# Altium integrated library LEMO Unipole And Multipole Type Connectors.IntLib: 1566 symbols (part 11 of 13)
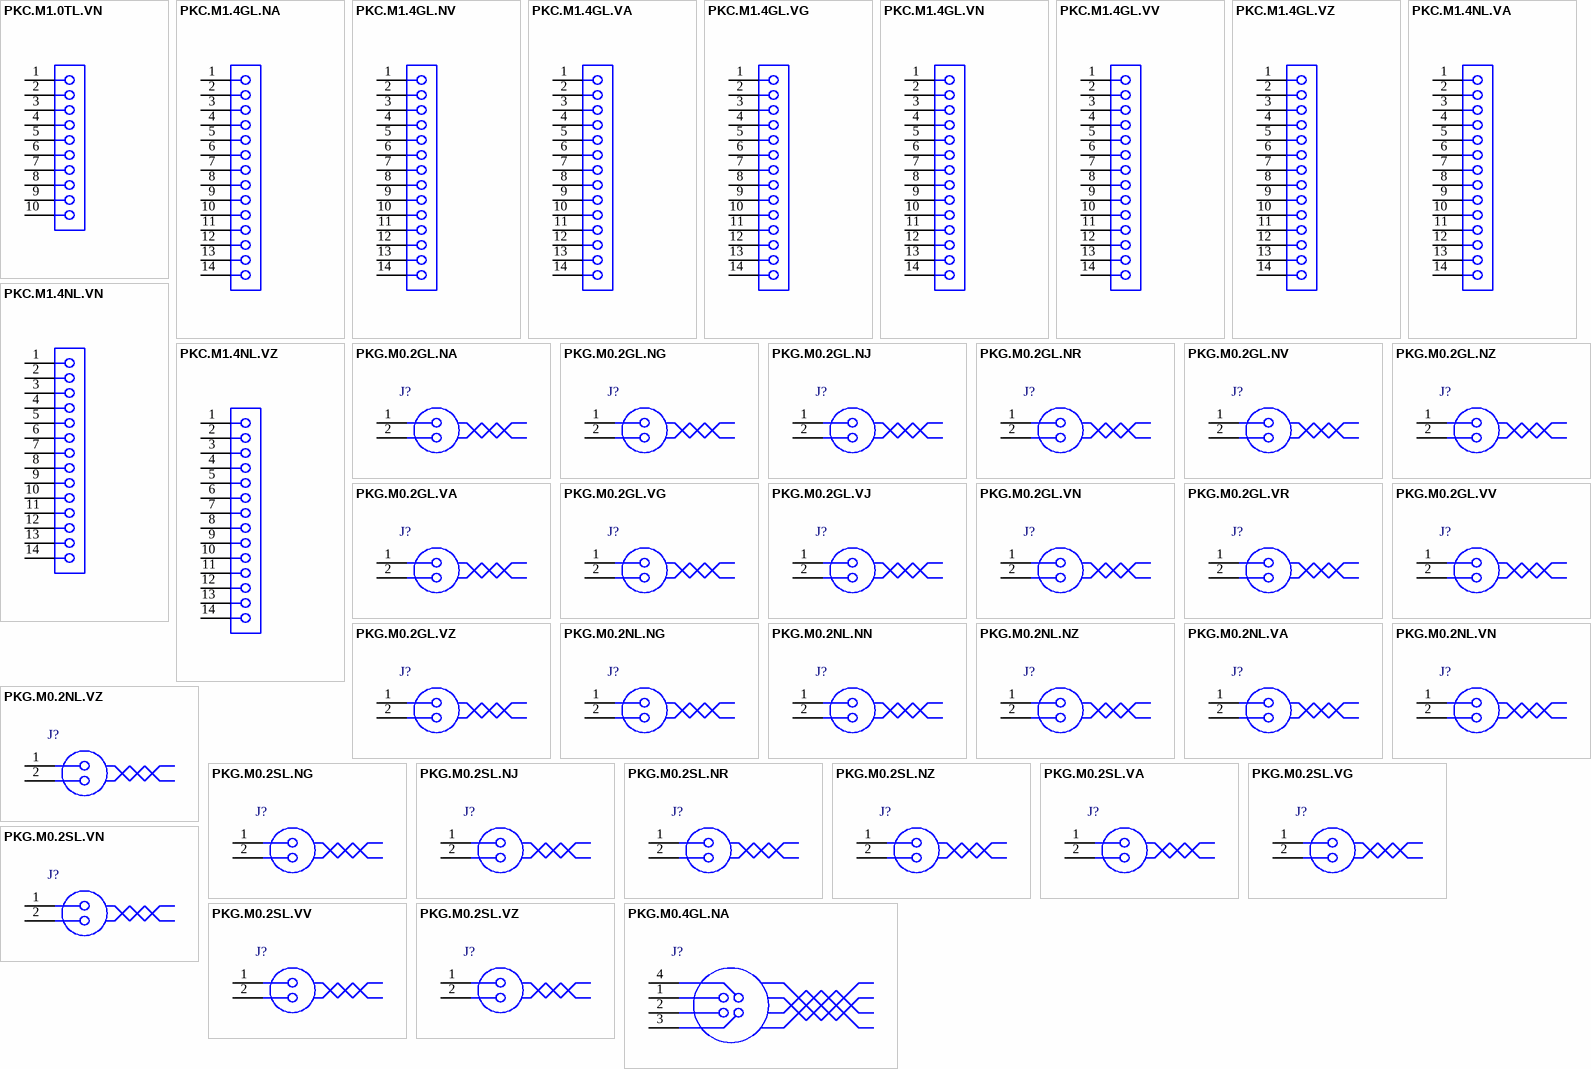
[diagram p53: symbols PKC.M1.0TL.VN to PKG.M0.4GL.NA]

## PKG.M0.2NL.VZ
designator J?
Fixed receptacle with 1 nut (without 2nd front nut), Key (G), P series, Multipole Type with 2 Contacts; Manufacturer: LEMO; PartNumber: PKG.M0.2NL.VZ; Number of contacts: 2; Contact Diameter: 1.3 mm; Test voltage (kV rms) Contact-Contact: 1.2; Rated Current(A): 10; DatasheetVersion: Jun-14; PackageReference: PKG.M0.2NL.VZ; PackageDescription: Fixed receptacle with 1 nut (without 2nd front nut), Key(G) for Printed Circuit; ComponentLink1Description: Manufacturer URL; ComponentLink1URL: http://www.lemo.com; ComponentLink2Description: Datasheet; ComponentLink2URL: http://intra.lemo.ch/catalog/ROW/UK_English/P_series_catalog.pdf
footprint PKG.M0.2NL.VZ (Socket, Female, Height 33.5 mm, Through hole)
pins: 1, 2

## PKG.M0.2SL.NG
designator J?
Fixed receptacle with two nuts (back panel mounting), straight print contacts, Key (G),  series, Multipole Type with 2 Contacts; Manufacturer: LEMO; PartNumber: PKG.M0.2SL.NG; Number of contacts: 2; Contact Diameter: 1.3 mm; Test voltage (kV rms) Contact-Contact: 1.2; Rated Current(A): 10; DatasheetVersion: Jun-14; PackageReference: PKG.M0.2SL.NG; PackageDescription: Fixed receptacle with two nuts (back panel mounting), straight print contacts, Key(G) for Printed Circuit; Supplier 1: Mouser; Supplier Part Number 1: 736-PKGM02SLNG; Supplier 2: Digi-Key; Supplier Part Number 2: PKG.M0.2SL.NG-ND; ComponentLink1Description: Manufacturer URL; ComponentLink1URL: http://www.lemo.com; ComponentLink2Description: Datasheet; ComponentLink2URL: http://intra.lemo.ch/catalog/ROW/UK_English/P_series_catalog.pdf
footprint PKG.M0.2SL.NG (Socket, Female, Height 33.5 mm, Through hole)
pins: 1, 2

## PKG.M0.2SL.NJ
designator J?
Fixed receptacle with two nuts (back panel mounting), straight print contacts, Key (G),  series, Multipole Type with 2 Contacts; Manufacturer: LEMO; PartNumber: PKG.M0.2SL.NJ; Number of contacts: 2; Contact Diameter: 1.3 mm; Test voltage (kV rms) Contact-Contact: 1.2; Rated Current(A): 10; DatasheetVersion: Jun-14; PackageReference: PKG.M0.2SL.NJ; PackageDescription: Fixed receptacle with two nuts (back panel mounting), straight print contacts, Key(G) for Printed Circuit; Supplier 1: Mouser; Supplier Part Number 1: 736-PKGM02SLNJ; Supplier 2: Digi-Key; Supplier Part Number 2: PKG.M0.2SL.NJ-ND; ComponentLink1Description: Manufacturer URL; ComponentLink1URL: http://www.lemo.com; ComponentLink2Description: Datasheet; ComponentLink2URL: http://intra.lemo.ch/catalog/ROW/UK_English/P_series_catalog.pdf
footprint PKG.M0.2SL.NJ (Socket, Female, Height 33.5 mm, Through hole)
pins: 1, 2

## PKG.M0.2SL.NR
designator J?
Fixed receptacle with two nuts (back panel mounting), straight print contacts, Key (G),  series, Multipole Type with 2 Contacts; Manufacturer: LEMO; PartNumber: PKG.M0.2SL.NR; Number of contacts: 2; Contact Diameter: 1.3 mm; Test voltage (kV rms) Contact-Contact: 1.2; Rated Current(A): 10; DatasheetVersion: Jun-14; PackageReference: PKG.M0.2SL.NR; PackageDescription: Fixed receptacle with two nuts (back panel mounting), straight print contacts, Key(G) for Printed Circuit; Supplier 1: Mouser; Supplier Part Number 1: 736-PKGM02SLNR; Supplier 2: Digi-Key; Supplier Part Number 2: PKG.M0.2SL.NR-ND; ComponentLink1Description: Manufacturer URL; ComponentLink1URL: http://www.lemo.com; ComponentLink2Description: Datasheet; ComponentLink2URL: http://intra.lemo.ch/catalog/ROW/UK_English/P_series_catalog.pdf
footprint PKG.M0.2SL.NR (Socket, Female, Height 33.5 mm, Through hole)
pins: 1, 2

## PKG.M0.2SL.NZ
designator J?
Fixed receptacle with 1 nut (without 2nd front nut), Key (G), P series, Multipole Type with 2 Contacts; Manufacturer: LEMO; PartNumber: PKG.M0.2SL.NZ; Number of contacts: 2; Contact Diameter: 1.3 mm; Test voltage (kV rms) Contact-Contact: 1.2; Rated Current(A): 10; DatasheetVersion: Jun-14; PackageReference: PKG.M0.2SL.NZ; PackageDescription: Fixed receptacle with 1 nut (without 2nd front nut), Key(G) for Printed Circuit; Supplier 1: Mouser; Supplier Part Number 1: 736-PKGM02SLNZ; Supplier 2: Digi-Key; Supplier Part Number 2: PKG.M0.2SL.NZ-ND; ComponentLink1Description: Manufacturer URL; ComponentLink1URL: http://www.lemo.com; ComponentLink2Description: Datasheet; ComponentLink2URL: http://intra.lemo.ch/catalog/ROW/UK_English/P_series_catalog.pdf
footprint PKG.M0.2SL.NZ (Socket, Female, Height 25 mm, Through hole)
pins: 1, 2

## PKG.M0.2SL.VA
designator J?
Fixed receptacle with two nuts (back panel mounting), 90° print contacts, Key (G),  series, Multipole Type with 2 Contacts; Manufacturer: LEMO; PartNumber: PKG.M0.2SL.VA; Number of contacts: 2; Contact Diameter: 1.3 mm; Test voltage (kV rms) Contact-Contact: 1.2; Rated Current(A): 10; DatasheetVersion: Jun-14; PackageReference: PKG.M0.2SL.VA; PackageDescription: Fixed receptacle with two nuts (back panel mounting), 90° print contacts, Key(G) for Printed Circuit; Supplier 1: Mouser; Supplier Part Number 1: 736-PKGM02SLVA; Supplier 2: Digi-Key; Supplier Part Number 2: PKG.M0.2SL.VA-ND; ComponentLink1Description: Manufacturer URL; ComponentLink1URL: http://www.lemo.com; ComponentLink2Description: Datasheet; ComponentLink2URL: http://intra.lemo.ch/catalog/ROW/UK_English/P_series_catalog.pdf
footprint PKG.M0.2SL.VA (Socket, Female, Height 33.5 mm, Through hole)
pins: 1, 2

## PKG.M0.2SL.VG
designator J?
Fixed receptacle with two nuts (back panel mounting), 90° print contacts, Key (G), P series, Multipole Type with 2 Contacts; Manufacturer: LEMO; PartNumber: PKG.M0.2SL.VG; Number of contacts: 2; Contact Diameter: 1.3 mm; Test voltage (kV rms) Contact-Contact: 1.2; Rated Current(A): 10; DatasheetVersion: Jun-14; PackageReference: PKG.M0.2SL.VG; PackageDescription: Fixed receptacle with two nuts (back panel mounting), 90° print contacts, Key(G) for Printed Circuit; Supplier 1: Mouser; Supplier Part Number 1: 736-PKGM02SLVG; Supplier 2: Digi-Key; Supplier Part Number 2: PKG.M0.2SL.VG-ND; ComponentLink1Description: Manufacturer URL; ComponentLink1URL: http://www.lemo.com; ComponentLink2Description: Datasheet; ComponentLink2URL: http://intra.lemo.ch/catalog/ROW/UK_English/P_series_catalog.pdf
footprint PKG.M0.2SL.VG (Socket, Female, Height 33.5 mm, Through hole)
pins: 1, 2

## PKG.M0.2SL.VN
designator J?
Fixed receptacle with two nuts (back panel mounting), 90° print contacts, Key (G),  series, Multipole Type with 2 Contacts; Manufacturer: LEMO; PartNumber: PKG.M0.2SL.VN; Number of contacts: 2; Contact Diameter: 1.3 mm; Test voltage (kV rms) Contact-Contact: 1.2; Rated Current(A): 10; DatasheetVersion: Jun-14; PackageReference: PKG.M0.2SL.VN; PackageDescription: Fixed receptacle with two nuts (back panel mounting), 90° print contacts, Key(G) for Printed Circuit; Supplier 1: Mouser; Supplier Part Number 1: 736-PKGM02SLVN; Supplier 2: Digi-Key; Supplier Part Number 2: PKG.M0.2SL.VN-ND; ComponentLink1Description: Manufacturer URL; ComponentLink1URL: http://www.lemo.com; ComponentLink2Description: Datasheet; ComponentLink2URL: http://intra.lemo.ch/catalog/ROW/UK_English/P_series_catalog.pdf
footprint PKG.M0.2SL.VN (Socket, Female, Height 33.5 mm, Through hole)
pins: 1, 2

## PKG.M0.2SL.VV
designator J?
Fixed receptacle with two nuts (back panel mounting), 90° print contacts, Key (G),  series, Multipole Type with 2 Contacts; Manufacturer: LEMO; PartNumber: PKG.M0.2SL.VV; Number of contacts: 2; Contact Diameter: 1.3 mm; Test voltage (kV rms) Contact-Contact: 1.2; Rated Current(A): 10; DatasheetVersion: Jun-14; PackageReference: PKG.M0.2SL.VV; PackageDescription: Fixed receptacle with two nuts (back panel mounting), 90° print contacts, Key(G) for Printed Circuit; Supplier 1: Mouser; Supplier Part Number 1: 736-PKGM02SLVV; Supplier 2: Digi-Key; Supplier Part Number 2: PKG.M0.2SL.VV-ND; ComponentLink1Description: Manufacturer URL; ComponentLink1URL: http://www.lemo.com; ComponentLink2Description: Datasheet; ComponentLink2URL: http://intra.lemo.ch/catalog/ROW/UK_English/P_series_catalog.pdf
footprint PKG.M0.2SL.VV (Socket, Female, Height 33.5 mm, Through hole)
pins: 1, 2

## PKG.M0.2SL.VZ
designator J?
Fixed receptacle with 1 nut (without 2nd front nut), Key (G), P series, Multipole Type with 2 Contacts; Manufacturer: LEMO; PartNumber: PKG.M0.2SL.VZ; Number of contacts: 2; Contact Diameter: 1.3 mm; Test voltage (kV rms) Contact-Contact: 1.2; Rated Current(A): 10; DatasheetVersion: Jun-14; PackageReference: PKG.M0.2SL.VZ; PackageDescription: Fixed receptacle with 1 nut (without 2nd front nut), Key(G) for Printed Circuit; Supplier 1: Mouser; Supplier Part Number 1: 736-PKGM02SLVZ; Supplier 2: Digi-Key; Supplier Part Number 2: PKG.M0.2SL.VZ-ND; ComponentLink1Description: Manufacturer URL; ComponentLink1URL: http://www.lemo.com; ComponentLink2Description: Datasheet; ComponentLink2URL: http://intra.lemo.ch/catalog/ROW/UK_English/P_series_catalog.pdf
footprint PKG.M0.2SL.VZ (Socket, Female, Height 33.5 mm, Through hole)
pins: 1, 2

## PKG.M0.4GL.NA
designator J?
Fixed receptacle with two nuts (back panel mounting), straight print contacts, Key (G), P series, Multipole Type with 4 Contacts; Manufacturer: LEMO; PartNumber: PKG.M0.4GL.NA; Number of contacts: 4; Contact Diameter: 0.9 mm; Test voltage (kV rms) Contact-Contact: 1.2; Rated Current(A): 8; DatasheetVersion: Jun-14; PackageReference: PKG.M0.4GL.NA; PackageDescription: Fixed receptacle with two nuts (back panel mounting), straight print contacts, Key(G) for Printed Circuit; ComponentLink1Description: Manufacturer URL; ComponentLink1URL: http://www.lemo.com; ComponentLink2Description: Datasheet; ComponentLink2URL: http://intra.lemo.ch/catalog/ROW/UK_English/P_series_catalog.pdf
footprint PKG.M0.4GL.NA (Socket, Female, Height 33.5 mm, Through hole)
pins: 1, 2, 3, 4

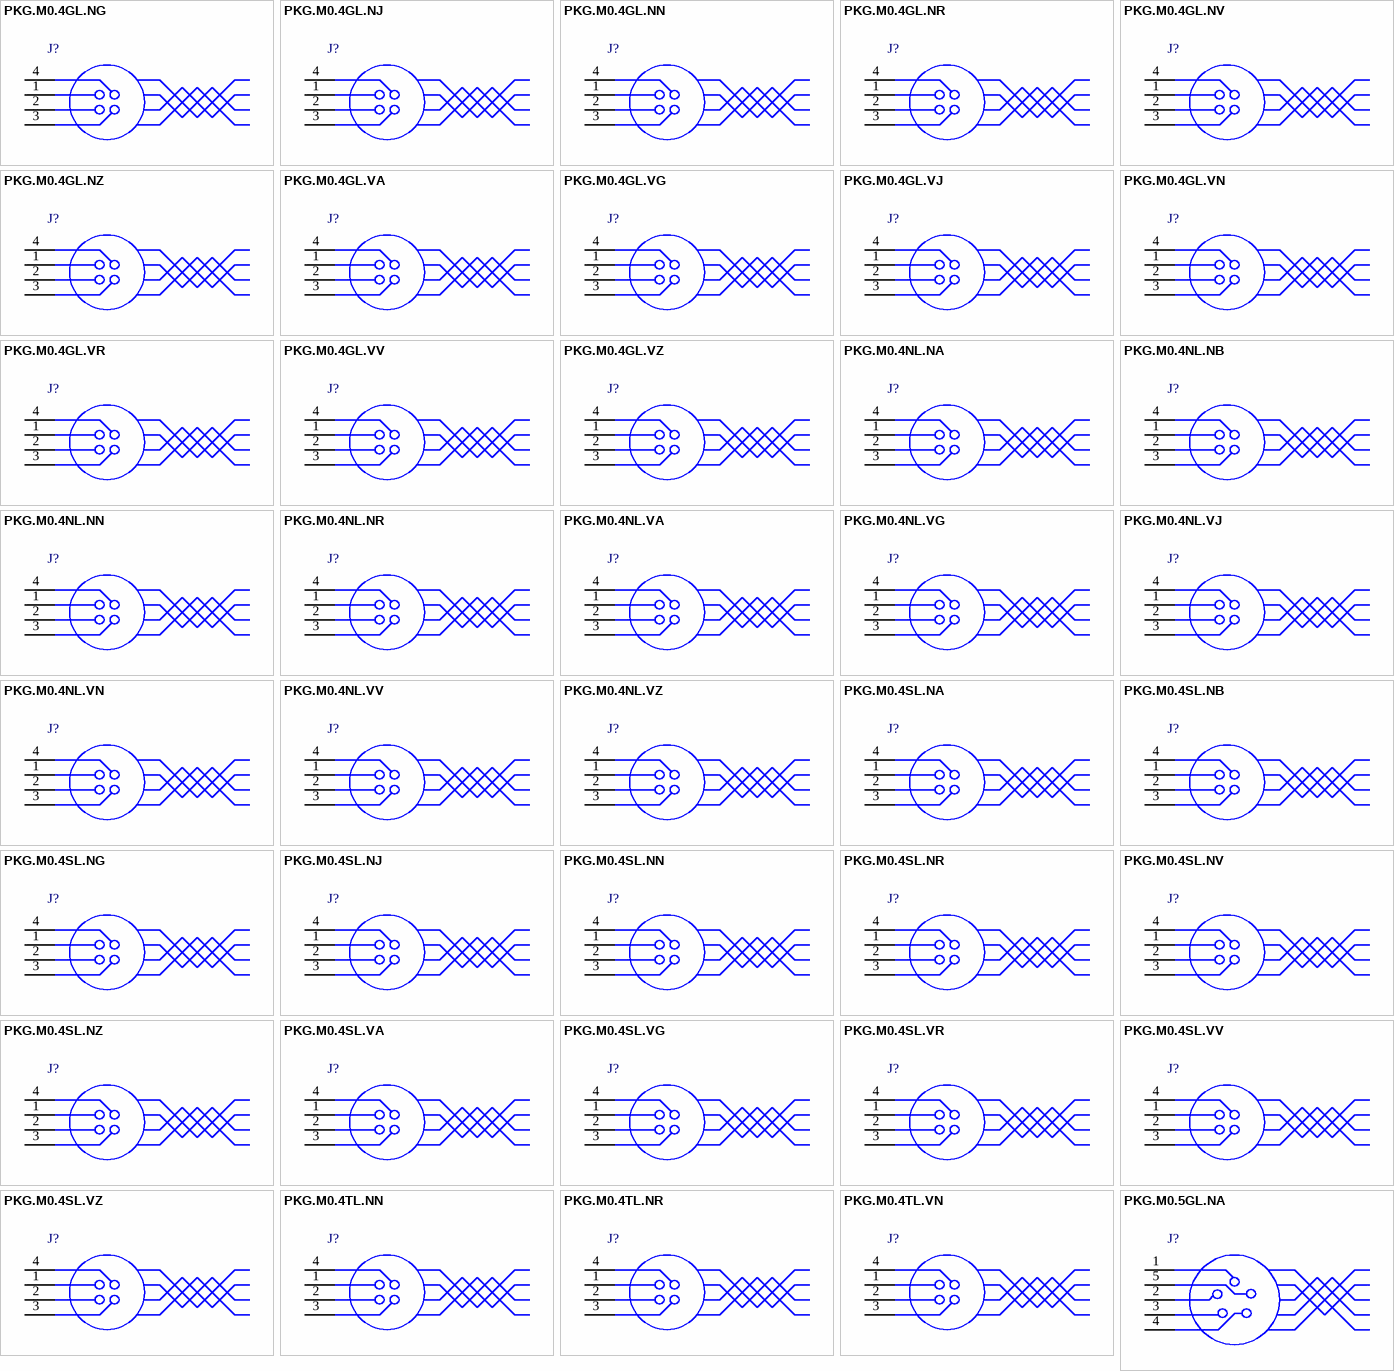
[diagram p34: symbols PKG.M0.4GL.NG to PKG.M0.5GL.NA]

## PKG.M0.4GL.NG
designator J?
Fixed receptacle with two nuts (back panel mounting), straight print contacts, Key (G), P series, Multipole Type with 4 Contacts; Manufacturer: LEMO; PartNumber: PKG.M0.4GL.NG; Number of contacts: 4; Contact Diameter: 0.9 mm; Test voltage (kV rms) Contact-Contact: 1.2; Rated Current(A): 8; DatasheetVersion: Jun-14; PackageReference: PKG.M0.4GL.NG; PackageDescription: Fixed receptacle with two nuts (back panel mounting), straight print contacts, Key(G) for Printed Circuit; ComponentLink1Description: Manufacturer URL; ComponentLink1URL: http://www.lemo.com; ComponentLink2Description: Datasheet; ComponentLink2URL: http://intra.lemo.ch/catalog/ROW/UK_English/P_series_catalog.pdf
footprint PKG.M0.4GL.NG (Socket, Female, Height 33.5 mm, Through hole)
pins: 1, 2, 3, 4

## PKG.M0.4GL.NJ
designator J?
Fixed receptacle with two nuts (back panel mounting), straight print contacts, Key (G), P series, Multipole Type with 4 Contacts; Manufacturer: LEMO; PartNumber: PKG.M0.4GL.NJ; Number of contacts: 4; Contact Diameter: 0.9 mm; Test voltage (kV rms) Contact-Contact: 1.2; Rated Current(A): 8; DatasheetVersion: Jun-14; PackageReference: PKG.M0.4GL.NJ; PackageDescription: Fixed receptacle with two nuts (back panel mounting), straight print contacts, Key(G) for Printed Circuit; ComponentLink1Description: Manufacturer URL; ComponentLink1URL: http://www.lemo.com; ComponentLink2Description: Datasheet; ComponentLink2URL: http://intra.lemo.ch/catalog/ROW/UK_English/P_series_catalog.pdf
footprint PKG.M0.4GL.NJ (Socket, Female, Height 33.5 mm, Through hole)
pins: 1, 2, 3, 4

## PKG.M0.4GL.NN
designator J?
Fixed receptacle with two nuts (back panel mounting), straight print contacts, Key (G), P series, Multipole Type with 4 Contacts; Manufacturer: LEMO; PartNumber: PKG.M0.4GL.NN; Number of contacts: 4; Contact Diameter: 0.9 mm; Test voltage (kV rms) Contact-Contact: 1.2; Rated Current(A): 8; DatasheetVersion: Jun-14; PackageReference: PKG.M0.4GL.NN; PackageDescription: Fixed receptacle with two nuts (back panel mounting), straight print contacts, Key(G) for Printed Circuit; ComponentLink1Description: Manufacturer URL; ComponentLink1URL: http://www.lemo.com; ComponentLink2Description: Datasheet; ComponentLink2URL: http://intra.lemo.ch/catalog/ROW/UK_English/P_series_catalog.pdf
footprint PKG.M0.4GL.NN (Socket, Female, Height 33.5 mm, Through hole)
pins: 1, 2, 3, 4

## PKG.M0.4GL.NR
designator J?
Fixed receptacle with two nuts (back panel mounting), straight print contacts, Key (G), P series, Multipole Type with 4 Contacts; Manufacturer: LEMO; PartNumber: PKG.M0.4GL.NR; Number of contacts: 4; Contact Diameter: 0.9 mm; Test voltage (kV rms) Contact-Contact: 1.2; Rated Current(A): 8; DatasheetVersion: Jun-14; PackageReference: PKG.M0.4GL.NR; PackageDescription: Fixed receptacle with two nuts (back panel mounting), straight print contacts, Key(G) for Printed Circuit; ComponentLink1Description: Manufacturer URL; ComponentLink1URL: http://www.lemo.com; ComponentLink2Description: Datasheet; ComponentLink2URL: http://intra.lemo.ch/catalog/ROW/UK_English/P_series_catalog.pdf
footprint PKG.M0.4GL.NR (Socket, Female, Height 33.5 mm, Through hole)
pins: 1, 2, 3, 4

## PKG.M0.4GL.NV
designator J?
Fixed receptacle with two nuts (back panel mounting), straight print contacts, Key (G), P series, Multipole Type with 4 Contacts; Manufacturer: LEMO; PartNumber: PKG.M0.4GL.NV; Number of contacts: 4; Contact Diameter: 0.9 mm; Test voltage (kV rms) Contact-Contact: 1.2; Rated Current(A): 8; DatasheetVersion: Jun-14; PackageReference: PKG.M0.4GL.NV; PackageDescription: Fixed receptacle with two nuts (back panel mounting), straight print contacts, Key(G) for Printed Circuit; ComponentLink1Description: Manufacturer URL; ComponentLink1URL: http://www.lemo.com; ComponentLink2Description: Datasheet; ComponentLink2URL: http://intra.lemo.ch/catalog/ROW/UK_English/P_series_catalog.pdf
footprint PKG.M0.4GL.NV (Socket, Female, Height 33.5 mm, Through hole)
pins: 1, 2, 3, 4

## PKG.M0.4GL.NZ
designator J?
Fixed receptacle with 1 nut (without 2nd front nut), Key (G), P series, Multipole Type with 4 Contacts; Manufacturer: LEMO; PartNumber: PKG.M0.4GL.NZ; Number of contacts: 4; Contact Diameter: 0.9 mm; Test voltage (kV rms) Contact-Contact: 1.2; Rated Current(A): 8; DatasheetVersion: Jun-14; PackageReference: PKG.M0.4GL.NZ; PackageDescription: Fixed receptacle with 1 nut (without 2nd front nut), Key(G) for Printed Circuit; ComponentLink1Description: Manufacturer URL; ComponentLink1URL: http://www.lemo.com; ComponentLink2Description: Datasheet; ComponentLink2URL: http://intra.lemo.ch/catalog/ROW/UK_English/P_series_catalog.pdf
footprint PKG.M0.4GL.NZ (Socket, Female, Height 25 mm, Through hole)
pins: 1, 2, 3, 4

## PKG.M0.4GL.VA
designator J?
Fixed receptacle with two nuts (back panel mounting), 90° print contacts, Key (G), P series, Multipole Type with 4 Contacts; Manufacturer: LEMO; PartNumber: PKG.M0.4GL.VA; Number of contacts: 4; Contact Diameter: 0.9 mm; Test voltage (kV rms) Contact-Contact: 1.2; Rated Current(A): 8; DatasheetVersion: Jun-14; PackageReference: PKG.M0.4GL.VA; PackageDescription: Fixed receptacle with two nuts (back panel mounting), 90° print contacts, Key(G) for Printed Circuit; ComponentLink1Description: Manufacturer URL; ComponentLink1URL: http://www.lemo.com; ComponentLink2Description: Datasheet; ComponentLink2URL: http://intra.lemo.ch/catalog/ROW/UK_English/P_series_catalog.pdf
footprint PKG.M0.4GL.VA (Socket, Female, Height 33.5 mm, Through hole)
pins: 1, 2, 3, 4

## PKG.M0.4GL.VG
designator J?
Fixed receptacle with two nuts (back panel mounting), 90° print contacts, Key (G), P series, Multipole Type with 4 Contacts; Manufacturer: LEMO; PartNumber: PKG.M0.4GL.VG; Number of contacts: 4; Contact Diameter: 0.9 mm; Test voltage (kV rms) Contact-Contact: 1.2; Rated Current(A): 8; DatasheetVersion: Jun-14; PackageReference: PKG.M0.4GL.VG; PackageDescription: Fixed receptacle with two nuts (back panel mounting), 90° print contacts, Key(G) for Printed Circuit; ComponentLink1Description: Manufacturer URL; ComponentLink1URL: http://www.lemo.com; ComponentLink2Description: Datasheet; ComponentLink2URL: http://intra.lemo.ch/catalog/ROW/UK_English/P_series_catalog.pdf
footprint PKG.M0.4GL.VG (Socket, Female, Height 33.5 mm, Through hole)
pins: 1, 2, 3, 4

## PKG.M0.4GL.VJ
designator J?
Fixed receptacle with two nuts (back panel mounting), 90° print contacts, Key (G), P series, Multipole Type with 4 Contacts; Manufacturer: LEMO; PartNumber: PKG.M0.4GL.VJ; Number of contacts: 4; Contact Diameter: 0.9 mm; Test voltage (kV rms) Contact-Contact: 1.2; Rated Current(A): 8; DatasheetVersion: Jun-14; PackageReference: PKG.M0.4GL.VJ; PackageDescription: Fixed receptacle with two nuts (back panel mounting), 90° print contacts, Key(G) for Printed Circuit; ComponentLink1Description: Manufacturer URL; ComponentLink1URL: http://www.lemo.com; ComponentLink2Description: Datasheet; ComponentLink2URL: http://intra.lemo.ch/catalog/ROW/UK_English/P_series_catalog.pdf
footprint PKG.M0.4GL.VJ (Socket, Female, Height 33.5 mm, Through hole)
pins: 1, 2, 3, 4

## PKG.M0.4GL.VN
designator J?
Fixed receptacle with two nuts (back panel mounting), 90° print contacts, Key (G), P series, Multipole Type with 4 Contacts; Manufacturer: LEMO; PartNumber: PKG.M0.4GL.VN; Number of contacts: 4; Contact Diameter: 0.9 mm; Test voltage (kV rms) Contact-Contact: 1.2; Rated Current(A): 8; DatasheetVersion: Jun-14; PackageReference: PKG.M0.4GL.VN; PackageDescription: Fixed receptacle with two nuts (back panel mounting), 90° print contacts, Key(G) for Printed Circuit; ComponentLink1Description: Manufacturer URL; ComponentLink1URL: http://www.lemo.com; ComponentLink2Description: Datasheet; ComponentLink2URL: http://intra.lemo.ch/catalog/ROW/UK_English/P_series_catalog.pdf
footprint PKG.M0.4GL.VN (Socket, Female, Height 33.5 mm, Through hole)
pins: 1, 2, 3, 4

## PKG.M0.4GL.VR
designator J?
Fixed receptacle with two nuts (back panel mounting), 90° print contacts, Key (G), P series, Multipole Type with 4 Contacts; Manufacturer: LEMO; PartNumber: PKG.M0.4GL.VR; Number of contacts: 4; Contact Diameter: 0.9 mm; Test voltage (kV rms) Contact-Contact: 1.2; Rated Current(A): 8; DatasheetVersion: Jun-14; PackageReference: PKG.M0.4GL.VR; PackageDescription: Fixed receptacle with two nuts (back panel mounting), 90° print contacts, Key(G) for Printed Circuit; Supplier 1: Mouser; Supplier Part Number 1: 736-PKGM04GLVR; Supplier 2: Digi-Key; Supplier Part Number 2: PKG.M0.4GL.VR-ND; ComponentLink1Description: Manufacturer URL; ComponentLink1URL: http://www.lemo.com; ComponentLink2Description: Datasheet; ComponentLink2URL: http://intra.lemo.ch/catalog/ROW/UK_English/P_series_catalog.pdf
footprint PKG.M0.4GL.VR (Socket, Female, Height 33.5 mm, Through hole)
pins: 1, 2, 3, 4

## PKG.M0.4GL.VV
designator J?
Fixed receptacle with two nuts (back panel mounting), 90° print contacts, Key (G), P series, Multipole Type with 4 Contacts; Manufacturer: LEMO; PartNumber: PKG.M0.4GL.VV; Number of contacts: 4; Contact Diameter: 0.9 mm; Test voltage (kV rms) Contact-Contact: 1.2; Rated Current(A): 8; DatasheetVersion: Jun-14; PackageReference: PKG.M0.4GL.VV; PackageDescription: Fixed receptacle with two nuts (back panel mounting), 90° print contacts, Key(G) for Printed Circuit; ComponentLink1Description: Manufacturer URL; ComponentLink1URL: http://www.lemo.com; ComponentLink2Description: Datasheet; ComponentLink2URL: http://intra.lemo.ch/catalog/ROW/UK_English/P_series_catalog.pdf
footprint PKG.M0.4GL.VV (Socket, Female, Height 33.5 mm, Through hole)
pins: 1, 2, 3, 4

## PKG.M0.4GL.VZ
designator J?
Fixed receptacle with 1 nut (without 2nd front nut), Key (G), P series, Multipole Type with 4 Contacts; Manufacturer: LEMO; PartNumber: PKG.M0.4GL.VZ; Number of contacts: 4; Contact Diameter: 0.9 mm; Test voltage (kV rms) Contact-Contact: 1.2; Rated Current(A): 8; DatasheetVersion: Jun-14; PackageReference: PKG.M0.4GL.VZ; PackageDescription: Fixed receptacle with 1 nut (without 2nd front nut), Key(G) for Printed Circuit; Supplier 1: Mouser; Supplier Part Number 1: 736-PKGM04GLVZ; Supplier 2: Digi-Key; Supplier Part Number 2: PKG.M0.4GL.VZ-ND; ComponentLink1Description: Manufacturer URL; ComponentLink1URL: http://www.lemo.com; ComponentLink2Description: Datasheet; ComponentLink2URL: http://intra.lemo.ch/catalog/ROW/UK_English/P_series_catalog.pdf
footprint PKG.M0.4GL.VZ (Socket, Female, Height 33.5 mm, Through hole)
pins: 1, 2, 3, 4

## PKG.M0.4NL.NA
designator J?
Fixed receptacle with two nuts (back panel mounting), straight print contacts, Key (G), P series, Multipole Type with 4 Contacts; Manufacturer: LEMO; PartNumber: PKG.M0.4NL.NA; Number of contacts: 4; Contact Diameter: 0.9 mm; Test voltage (kV rms) Contact-Contact: 1.2; Rated Current(A): 8; DatasheetVersion: Jun-14; PackageReference: PKG.M0.4NL.NA; PackageDescription: Fixed receptacle with two nuts (back panel mounting), straight print contacts, Key(G) for Printed Circuit; ComponentLink1Description: Manufacturer URL; ComponentLink1URL: http://www.lemo.com; ComponentLink2Description: Datasheet; ComponentLink2URL: http://intra.lemo.ch/catalog/ROW/UK_English/P_series_catalog.pdf
footprint PKG.M0.4NL.NA (Socket, Female, Height 33.5 mm, Through hole)
pins: 1, 2, 3, 4

## PKG.M0.4NL.NB
designator J?
Fixed receptacle with two nuts (back panel mounting), straight print contacts, Key (G), P series, Multipole Type with 4 Contacts; Manufacturer: LEMO; PartNumber: PKG.M0.4NL.NB; Number of contacts: 4; Contact Diameter: 0.9 mm; Test voltage (kV rms) Contact-Contact: 1.2; Rated Current(A): 8; DatasheetVersion: Jun-14; PackageReference: PKG.M0.4NL.NB; PackageDescription: Fixed receptacle with two nuts (back panel mounting), straight print contacts, Key(G) for Printed Circuit; ComponentLink1Description: Manufacturer URL; ComponentLink1URL: http://www.lemo.com; ComponentLink2Description: Datasheet; ComponentLink2URL: http://intra.lemo.ch/catalog/ROW/UK_English/P_series_catalog.pdf
footprint PKG.M0.4NL.NB (Socket, Female, Height 33.5 mm, Through hole)
pins: 1, 2, 3, 4

## PKG.M0.4NL.NN
designator J?
Fixed receptacle with two nuts (back panel mounting), straight print contacts, Key (G), P series, Multipole Type with 4 Contacts; Manufacturer: LEMO; PartNumber: PKG.M0.4NL.NN; Number of contacts: 4; Contact Diameter: 0.9 mm; Test voltage (kV rms) Contact-Contact: 1.2; Rated Current(A): 8; DatasheetVersion: Jun-14; PackageReference: PKG.M0.4NL.NN; PackageDescription: Fixed receptacle with two nuts (back panel mounting), straight print contacts, Key(G) for Printed Circuit; ComponentLink1Description: Manufacturer URL; ComponentLink1URL: http://www.lemo.com; ComponentLink2Description: Datasheet; ComponentLink2URL: http://intra.lemo.ch/catalog/ROW/UK_English/P_series_catalog.pdf
footprint PKG.M0.4NL.NN (Socket, Female, Height 33.5 mm, Through hole)
pins: 1, 2, 3, 4

## PKG.M0.4NL.NR
designator J?
Fixed receptacle with two nuts (back panel mounting), straight print contacts, Key (G), P series, Multipole Type with 4 Contacts; Manufacturer: LEMO; PartNumber: PKG.M0.4NL.NR; Number of contacts: 4; Contact Diameter: 0.9 mm; Test voltage (kV rms) Contact-Contact: 1.2; Rated Current(A): 8; DatasheetVersion: Jun-14; PackageReference: PKG.M0.4NL.NR; PackageDescription: Fixed receptacle with two nuts (back panel mounting), straight print contacts, Key(G) for Printed Circuit; ComponentLink1Description: Manufacturer URL; ComponentLink1URL: http://www.lemo.com; ComponentLink2Description: Datasheet; ComponentLink2URL: http://intra.lemo.ch/catalog/ROW/UK_English/P_series_catalog.pdf
footprint PKG.M0.4NL.NR (Socket, Female, Height 33.5 mm, Through hole)
pins: 1, 2, 3, 4

## PKG.M0.4NL.VA
designator J?
Fixed receptacle with two nuts (back panel mounting), 90° print contacts, Key (G), P series, Multipole Type with 4 Contacts; Manufacturer: LEMO; PartNumber: PKG.M0.4NL.VA; Number of contacts: 4; Contact Diameter: 0.9 mm; Test voltage (kV rms) Contact-Contact: 1.2; Rated Current(A): 8; DatasheetVersion: Jun-14; PackageReference: PKG.M0.4NL.VA; PackageDescription: Fixed receptacle with two nuts (back panel mounting), 90° print contacts, Key(G) for Printed Circuit; ComponentLink1Description: Manufacturer URL; ComponentLink1URL: http://www.lemo.com; ComponentLink2Description: Datasheet; ComponentLink2URL: http://intra.lemo.ch/catalog/ROW/UK_English/P_series_catalog.pdf
footprint PKG.M0.4NL.VA (Socket, Female, Height 33.5 mm, Through hole)
pins: 1, 2, 3, 4

## PKG.M0.4NL.VG
designator J?
Fixed receptacle with two nuts (back panel mounting), 90° print contacts, Key (G),  series, Multipole Type with 4 Contacts; Manufacturer: LEMO; PartNumber: PKG.M0.4NL.VG; Number of contacts: 4; Contact Diameter: 0.9 mm; Test voltage (kV rms) Contact-Contact: 1.2; Rated Current(A): 8; DatasheetVersion: Jun-14; PackageReference: PKG.M0.4NL.VG; PackageDescription: Fixed receptacle with two nuts (back panel mounting), 90° print contacts, Key(G) for Printed Circuit; ComponentLink1Description: Manufacturer URL; ComponentLink1URL: http://www.lemo.com; ComponentLink2Description: Datasheet; ComponentLink2URL: http://intra.lemo.ch/catalog/ROW/UK_English/P_series_catalog.pdf
footprint PKG.M0.4NL.VG (Socket, Female, Height 33.5 mm, Through hole)
pins: 1, 2, 3, 4

## PKG.M0.4NL.VJ
designator J?
Fixed receptacle with two nuts (back panel mounting), 90° print contacts, Key (G),  series, Multipole Type with 4 Contacts; Manufacturer: LEMO; PartNumber: PKG.M0.4NL.VJ; Number of contacts: 4; Contact Diameter: 0.9 mm; Test voltage (kV rms) Contact-Contact: 1.2; Rated Current(A): 8; DatasheetVersion: Jun-14; PackageReference: PKG.M0.4NL.VJ; PackageDescription: Fixed receptacle with two nuts (back panel mounting), 90° print contacts, Key(G) for Printed Circuit; ComponentLink1Description: Manufacturer URL; ComponentLink1URL: http://www.lemo.com; ComponentLink2Description: Datasheet; ComponentLink2URL: http://intra.lemo.ch/catalog/ROW/UK_English/P_series_catalog.pdf
footprint PKG.M0.4NL.VJ (Socket, Female, Height 33.5 mm, Through hole)
pins: 1, 2, 3, 4

## PKG.M0.4NL.VN
designator J?
Fixed receptacle with two nuts (back panel mounting), 90° print contacts, Key (G), P series, Multipole Type with 4 Contacts; Manufacturer: LEMO; PartNumber: PKG.M0.4NL.VN; Number of contacts: 4; Contact Diameter: 0.9 mm; Test voltage (kV rms) Contact-Contact: 1.2; Rated Current(A): 8; DatasheetVersion: Jun-14; PackageReference: PKG.M0.4NL.VN; PackageDescription: Fixed receptacle with two nuts (back panel mounting), 90° print contacts, Key(G) for Printed Circuit; ComponentLink1Description: Manufacturer URL; ComponentLink1URL: http://www.lemo.com; ComponentLink2Description: Datasheet; ComponentLink2URL: http://intra.lemo.ch/catalog/ROW/UK_English/P_series_catalog.pdf
footprint PKG.M0.4NL.VN (Socket, Female, Height 33.5 mm, Through hole)
pins: 1, 2, 3, 4

## PKG.M0.4NL.VV
designator J?
Fixed receptacle with two nuts (back panel mounting), 90° print contacts, Key (G), P series, Multipole Type with 4 Contacts; Manufacturer: LEMO; PartNumber: PKG.M0.4NL.VV; Number of contacts: 4; Contact Diameter: 0.9 mm; Test voltage (kV rms) Contact-Contact: 1.2; Rated Current(A): 8; DatasheetVersion: Jun-14; PackageReference: PKG.M0.4NL.VV; PackageDescription: Fixed receptacle with two nuts (back panel mounting), 90° print contacts, Key(G) for Printed Circuit; ComponentLink1Description: Manufacturer URL; ComponentLink1URL: http://www.lemo.com; ComponentLink2Description: Datasheet; ComponentLink2URL: http://intra.lemo.ch/catalog/ROW/UK_English/P_series_catalog.pdf
footprint PKG.M0.4NL.VV (Socket, Female, Height 33.5 mm, Through hole)
pins: 1, 2, 3, 4

## PKG.M0.4NL.VZ
designator J?
Fixed receptacle with 1 nut (without 2nd front nut), Key (G), P series, Multipole Type with 4 Contacts; Manufacturer: LEMO; PartNumber: PKG.M0.4NL.VZ; Number of contacts: 4; Contact Diameter: 0.9 mm; Test voltage (kV rms) Contact-Contact: 1.2; Rated Current(A): 8; DatasheetVersion: Jun-14; PackageReference: PKG.M0.4NL.VZ; PackageDescription: Fixed receptacle with 1 nut (without 2nd front nut), Key(G) for Printed Circuit; ComponentLink1Description: Manufacturer URL; ComponentLink1URL: http://www.lemo.com; ComponentLink2Description: Datasheet; ComponentLink2URL: http://intra.lemo.ch/catalog/ROW/UK_English/P_series_catalog.pdf
footprint PKG.M0.4NL.VZ (Socket, Female, Height 33.5 mm, Through hole)
pins: 1, 2, 3, 4

## PKG.M0.4SL.NA
designator J?
Fixed receptacle with two nuts (back panel mounting), straight print contacts, Key (G),  series, Multipole Type with 4 Contacts; Manufacturer: LEMO; PartNumber: PKG.M0.4SL.NA; Number of contacts: 4; Contact Diameter: 0.9 mm; Test voltage (kV rms) Contact-Contact: 1.2; Rated Current(A): 8; DatasheetVersion: Jun-14; PackageReference: PKG.M0.4SL.NA; PackageDescription: Fixed receptacle with two nuts (back panel mounting), straight print contacts, Key(G) for Printed Circuit; Supplier 1: Mouser; Supplier Part Number 1: 736-PKGM04SLNA; Supplier 2: Digi-Key; Supplier Part Number 2: PKG.M0.4SL.NA-ND; ComponentLink1Description: Manufacturer URL; ComponentLink1URL: http://www.lemo.com; ComponentLink2Description: Datasheet; ComponentLink2URL: http://intra.lemo.ch/catalog/ROW/UK_English/P_series_catalog.pdf
footprint PKG.M0.4SL.NA (Socket, Female, Height 33.5 mm, Through hole)
pins: 1, 2, 3, 4

## PKG.M0.4SL.NB
designator J?
Fixed receptacle with two nuts (back panel mounting), straight print contacts, Key (G), P series, Multipole Type with 4 Contacts; Manufacturer: LEMO; PartNumber: PKG.M0.4SL.NB; Number of contacts: 4; Contact Diameter: 0.9 mm; Test voltage (kV rms) Contact-Contact: 1.2; Rated Current(A): 8; DatasheetVersion: Jun-14; PackageReference: PKG.M0.4SL.NB; PackageDescription: Fixed receptacle with two nuts (back panel mounting), straight print contacts, Key(G) for Printed Circuit; Supplier 1: Mouser; Supplier Part Number 1: 736-PKGM04SLNB; Supplier 2: Digi-Key; Supplier Part Number 2: PKG.M0.4SL.NB-ND; ComponentLink1Description: Manufacturer URL; ComponentLink1URL: http://www.lemo.com; ComponentLink2Description: Datasheet; ComponentLink2URL: http://intra.lemo.ch/catalog/ROW/UK_English/P_series_catalog.pdf
footprint PKG.M0.4SL.NB (Socket, Female, Height 33.5 mm, Through hole)
pins: 1, 2, 3, 4

## PKG.M0.4SL.NG
designator J?
Fixed receptacle with two nuts (back panel mounting), straight print contacts, Key (G), P series, Multipole Type with 4 Contacts; Manufacturer: LEMO; PartNumber: PKG.M0.4SL.NG; Number of contacts: 4; Contact Diameter: 0.9 mm; Test voltage (kV rms) Contact-Contact: 1.2; Rated Current(A): 8; DatasheetVersion: Jun-14; PackageReference: PKG.M0.4SL.NG; PackageDescription: Fixed receptacle with two nuts (back panel mounting), straight print contacts, Key(G) for Printed Circuit; Supplier 1: Mouser; Supplier Part Number 1: 736-PKGM04SLNG; Supplier 2: Digi-Key; Supplier Part Number 2: PKG.M0.4SL.NG-ND; ComponentLink1Description: Manufacturer URL; ComponentLink1URL: http://www.lemo.com; ComponentLink2Description: Datasheet; ComponentLink2URL: http://intra.lemo.ch/catalog/ROW/UK_English/P_series_catalog.pdf
footprint PKG.M0.4SL.NG (Socket, Female, Height 33.5 mm, Through hole)
pins: 1, 2, 3, 4

## PKG.M0.4SL.NJ
designator J?
Fixed receptacle with two nuts (back panel mounting), straight print contacts, Key (G),  series, Multipole Type with 4 Contacts; Manufacturer: LEMO; PartNumber: PKG.M0.4SL.NJ; Number of contacts: 4; Contact Diameter: 0.9 mm; Test voltage (kV rms) Contact-Contact: 1.2; Rated Current(A): 8; DatasheetVersion: Jun-14; PackageReference: PKG.M0.4SL.NJ; PackageDescription: Fixed receptacle with two nuts (back panel mounting), straight print contacts, Key(G) for Printed Circuit; Supplier 1: Mouser; Supplier Part Number 1: 736-PKGM04SLNJ; Supplier 2: Digi-Key; Supplier Part Number 2: PKG.M0.4SL.NJ-ND; ComponentLink1Description: Manufacturer URL; ComponentLink1URL: http://www.lemo.com; ComponentLink2Description: Datasheet; ComponentLink2URL: http://intra.lemo.ch/catalog/ROW/UK_English/P_series_catalog.pdf
footprint PKG.M0.4SL.NJ (Socket, Female, Height 33.5 mm, Through hole)
pins: 1, 2, 3, 4

## PKG.M0.4SL.NN
designator J?
Fixed receptacle with two nuts (back panel mounting), straight print contacts, Key (G),  series, Multipole Type with 4 Contacts; Manufacturer: LEMO; PartNumber: PKG.M0.4SL.NN; Number of contacts: 4; Contact Diameter: 0.9 mm; Test voltage (kV rms) Contact-Contact: 1.2; Rated Current(A): 8; DatasheetVersion: Jun-14; PackageReference: PKG.M0.4SL.NN; PackageDescription: Fixed receptacle with two nuts (back panel mounting), straight print contacts, Key(G) for Printed Circuit; Supplier 1: Mouser; Supplier Part Number 1: 736-PKGM04SLNN; Supplier 2: Digi-Key; Supplier Part Number 2: PKG.M0.4SL.NN-ND; ComponentLink1Description: Manufacturer URL; ComponentLink1URL: http://www.lemo.com; ComponentLink2Description: Datasheet; ComponentLink2URL: http://intra.lemo.ch/catalog/ROW/UK_English/P_series_catalog.pdf
footprint PKG.M0.4SL.NN (Socket, Female, Height 33.5 mm, Through hole)
pins: 1, 2, 3, 4

## PKG.M0.4SL.NR
designator J?
Fixed receptacle with two nuts (back panel mounting), straight print contacts, Key (G), P series, Multipole Type with 4 Contacts; Manufacturer: LEMO; PartNumber: PKG.M0.4SL.NR; Number of contacts: 4; Contact Diameter: 0.9 mm; Test voltage (kV rms) Contact-Contact: 1.2; Rated Current(A): 8; DatasheetVersion: Jun-14; PackageReference: PKG.M0.4SL.NR; PackageDescription: Fixed receptacle with two nuts (back panel mounting), straight print contacts, Key(G) for Printed Circuit; Supplier 1: Mouser; Supplier Part Number 1: 736-PKGM04SLNR; Supplier 2: Digi-Key; Supplier Part Number 2: PKG.M0.4SL.NR-ND; ComponentLink1Description: Manufacturer URL; ComponentLink1URL: http://www.lemo.com; ComponentLink2Description: Datasheet; ComponentLink2URL: http://intra.lemo.ch/catalog/ROW/UK_English/P_series_catalog.pdf
footprint PKG.M0.4SL.NR (Socket, Female, Height 33.5 mm, Through hole)
pins: 1, 2, 3, 4

## PKG.M0.4SL.NV
designator J?
Fixed receptacle with two nuts (back panel mounting), straight print contacts, Key (G), P series, Multipole Type with 4 Contacts; Manufacturer: LEMO; PartNumber: PKG.M0.4SL.NV; Number of contacts: 4; Contact Diameter: 0.9 mm; Test voltage (kV rms) Contact-Contact: 1.2; Rated Current(A): 8; DatasheetVersion: Jun-14; PackageReference: PKG.M0.4SL.NV; PackageDescription: Fixed receptacle with two nuts (back panel mounting), straight print contacts, Key(G) for Printed Circuit; Supplier 1: Mouser; Supplier Part Number 1: 736-PKGM04SLNV; Supplier 2: Digi-Key; Supplier Part Number 2: PKG.M0.4SL.NV-ND; ComponentLink1Description: Manufacturer URL; ComponentLink1URL: http://www.lemo.com; ComponentLink2Description: Datasheet; ComponentLink2URL: http://intra.lemo.ch/catalog/ROW/UK_English/P_series_catalog.pdf
footprint PKG.M0.4SL.NV (Socket, Female, Height 33.5 mm, Through hole)
pins: 1, 2, 3, 4

## PKG.M0.4SL.NZ
designator J?
Fixed receptacle with 1 nut (without 2nd front nut), Key (G), P series, Multipole Type with 4 Contacts; Manufacturer: LEMO; PartNumber: PKG.M0.4SL.NZ; Number of contacts: 4; Contact Diameter: 0.9 mm; Test voltage (kV rms) Contact-Contact: 1.2; Rated Current(A): 8; DatasheetVersion: Jun-14; PackageReference: PKG.M0.4SL.NZ; PackageDescription: Fixed receptacle with 1 nut (without 2nd front nut), Key(G) for Printed Circuit; Supplier 1: Mouser; Supplier Part Number 1: 736-PKGM04SLNZ; Supplier 2: Digi-Key; Supplier Part Number 2: PKG.M0.4SL.NZ-ND; ComponentLink1Description: Manufacturer URL; ComponentLink1URL: http://www.lemo.com; ComponentLink2Description: Datasheet; ComponentLink2URL: http://intra.lemo.ch/catalog/ROW/UK_English/P_series_catalog.pdf
footprint PKG.M0.4SL.NZ (Socket, Female, Height 25 mm, Through hole)
pins: 1, 2, 3, 4

## PKG.M0.4SL.VA
designator J?
Fixed receptacle with two nuts (back panel mounting), 90° print contacts, Key (G), P series, Multipole Type with 4 Contacts; Manufacturer: LEMO; PartNumber: PKG.M0.4SL.VA; Number of contacts: 4; Contact Diameter: 0.9 mm; Test voltage (kV rms) Contact-Contact: 1.2; Rated Current(A): 8; DatasheetVersion: Jun-14; PackageReference: PKG.M0.4SL.VA; PackageDescription: Fixed receptacle with two nuts (back panel mounting), 90° print contacts, Key(G) for Printed Circuit; Supplier 1: Mouser; Supplier Part Number 1: 736-PKGM04SLVA; Supplier 2: Digi-Key; Supplier Part Number 2: PKG.M0.4SL.VA-ND; ComponentLink1Description: Manufacturer URL; ComponentLink1URL: http://www.lemo.com; ComponentLink2Description: Datasheet; ComponentLink2URL: http://intra.lemo.ch/catalog/ROW/UK_English/P_series_catalog.pdf
footprint PKG.M0.4SL.VA (Socket, Female, Height 33.5 mm, Through hole)
pins: 1, 2, 3, 4

## PKG.M0.4SL.VG
designator J?
Fixed receptacle with two nuts (back panel mounting), 90° print contacts, Key (G),  series, Multipole Type with 4 Contacts; Manufacturer: LEMO; PartNumber: PKG.M0.4SL.VG; Number of contacts: 4; Contact Diameter: 0.9 mm; Test voltage (kV rms) Contact-Contact: 1.2; Rated Current(A): 8; DatasheetVersion: Jun-14; PackageReference: PKG.M0.4SL.VG; PackageDescription: Fixed receptacle with two nuts (back panel mounting), 90° print contacts, Key(G) for Printed Circuit; Supplier 1: Mouser; Supplier Part Number 1: 736-PKGM04SLVG; Supplier 2: Digi-Key; Supplier Part Number 2: PKG.M0.4SL.VG-ND; ComponentLink1Description: Manufacturer URL; ComponentLink1URL: http://www.lemo.com; ComponentLink2Description: Datasheet; ComponentLink2URL: http://intra.lemo.ch/catalog/ROW/UK_English/P_series_catalog.pdf
footprint PKG.M0.4SL.VG (Socket, Female, Height 33.5 mm, Through hole)
pins: 1, 2, 3, 4

## PKG.M0.4SL.VR
designator J?
Fixed receptacle with two nuts (back panel mounting), 90° print contacts, Key (G),  series, Multipole Type with 4 Contacts; Manufacturer: LEMO; PartNumber: PKG.M0.4SL.VR; Number of contacts: 4; Contact Diameter: 0.9 mm; Test voltage (kV rms) Contact-Contact: 1.2; Rated Current(A): 8; DatasheetVersion: Jun-14; PackageReference: PKG.M0.4SL.VR; PackageDescription: Fixed receptacle with two nuts (back panel mounting), 90° print contacts, Key(G) for Printed Circuit; Supplier 1: Mouser; Supplier Part Number 1: 736-PKGM04SLVR; Supplier 2: Digi-Key; Supplier Part Number 2: PKG.M0.4SL.VR-ND; ComponentLink1Description: Manufacturer URL; ComponentLink1URL: http://www.lemo.com; ComponentLink2Description: Datasheet; ComponentLink2URL: http://intra.lemo.ch/catalog/ROW/UK_English/P_series_catalog.pdf
footprint PKG.M0.4SL.VR (Socket, Female, Height 33.5 mm, Through hole)
pins: 1, 2, 3, 4

## PKG.M0.4SL.VV
designator J?
Fixed receptacle with two nuts (back panel mounting), 90° print contacts, Key (G),  series, Multipole Type with 4 Contacts; Manufacturer: LEMO; PartNumber: PKG.M0.4SL.VV; Number of contacts: 4; Contact Diameter: 0.9 mm; Test voltage (kV rms) Contact-Contact: 1.2; Rated Current(A): 8; DatasheetVersion: Jun-14; PackageReference: PKG.M0.4SL.VV; PackageDescription: Fixed receptacle with two nuts (back panel mounting), 90° print contacts, Key(G) for Printed Circuit; Supplier 1: Mouser; Supplier Part Number 1: 736-PKGM04SLVV; Supplier 2: Digi-Key; Supplier Part Number 2: PKG.M0.4SL.VV-ND; ComponentLink1Description: Manufacturer URL; ComponentLink1URL: http://www.lemo.com; ComponentLink2Description: Datasheet; ComponentLink2URL: http://intra.lemo.ch/catalog/ROW/UK_English/P_series_catalog.pdf
footprint PKG.M0.4SL.VV (Socket, Female, Height 33.5 mm, Through hole)
pins: 1, 2, 3, 4

## PKG.M0.4SL.VZ
designator J?
Fixed receptacle with 1 nut (without 2nd front nut), Key (G), P series, Multipole Type with 4 Contacts; Manufacturer: LEMO; PartNumber: PKG.M0.4SL.VZ; Number of contacts: 4; Contact Diameter: 0.9 mm; Test voltage (kV rms) Contact-Contact: 1.2; Rated Current(A): 8; DatasheetVersion: Jun-14; PackageReference: PKG.M0.4SL.VZ; PackageDescription: Fixed receptacle with 1 nut (without 2nd front nut), Key(G) for Printed Circuit; Supplier 1: Mouser; Supplier Part Number 1: 736-PKGM04SLVZ; Supplier 2: Digi-Key; Supplier Part Number 2: PKG.M0.4SL.VZ-ND; ComponentLink1Description: Manufacturer URL; ComponentLink1URL: http://www.lemo.com; ComponentLink2Description: Datasheet; ComponentLink2URL: http://intra.lemo.ch/catalog/ROW/UK_English/P_series_catalog.pdf
footprint PKG.M0.4SL.VZ (Socket, Female, Height 33.5 mm, Through hole)
pins: 1, 2, 3, 4

## PKG.M0.4TL.NN
designator J?
Fixed receptacle with two nuts (back panel mounting), straight print contacts, Key (G), P series, Multipole Type with 4 Contacts; Manufacturer: LEMO; PartNumber: PKG.M0.4TL.NN; Number of contacts: 4; Contact Diameter: 0.9 mm; Test voltage (kV rms) Contact-Contact: 1.2; Rated Current(A): 8; DatasheetVersion: Jun-14; PackageReference: PKG.M0.4TL.NN; PackageDescription: Fixed receptacle with two nuts (back panel mounting), straight print contacts, Key(G) for Printed Circuit; ComponentLink1Description: Manufacturer URL; ComponentLink1URL: http://www.lemo.com; ComponentLink2Description: Datasheet; ComponentLink2URL: http://intra.lemo.ch/catalog/ROW/UK_English/P_series_catalog.pdf
footprint PKG.M0.4TL.NN (Socket, Female, Height 33.5 mm, Through hole)
pins: 1, 2, 3, 4

## PKG.M0.4TL.NR
designator J?
Fixed receptacle with two nuts (back panel mounting), straight print contacts, Key (G), P series, Multipole Type with 4 Contacts; Manufacturer: LEMO; PartNumber: PKG.M0.4TL.NR; Number of contacts: 4; Contact Diameter: 0.9 mm; Test voltage (kV rms) Contact-Contact: 1.2; Rated Current(A): 8; DatasheetVersion: Jun-14; PackageReference: PKG.M0.4TL.NR; PackageDescription: Fixed receptacle with two nuts (back panel mounting), straight print contacts, Key(G) for Printed Circuit; ComponentLink1Description: Manufacturer URL; ComponentLink1URL: http://www.lemo.com; ComponentLink2Description: Datasheet; ComponentLink2URL: http://intra.lemo.ch/catalog/ROW/UK_English/P_series_catalog.pdf
footprint PKG.M0.4TL.NR (Socket, Female, Height 33.5 mm, Through hole)
pins: 1, 2, 3, 4

## PKG.M0.4TL.VN
designator J?
Fixed receptacle with two nuts (back panel mounting), 90° print contacts, Key (G), P series, Multipole Type with 4 Contacts; Manufacturer: LEMO; PartNumber: PKG.M0.4TL.VN; Number of contacts: 4; Contact Diameter: 0.9 mm; Test voltage (kV rms) Contact-Contact: 1.2; Rated Current(A): 8; DatasheetVersion: Jun-14; PackageReference: PKG.M0.4TL.VN; PackageDescription: Fixed receptacle with two nuts (back panel mounting), 90° print contacts, Key(G) for Printed Circuit; ComponentLink1Description: Manufacturer URL; ComponentLink1URL: http://www.lemo.com; ComponentLink2Description: Datasheet; ComponentLink2URL: http://intra.lemo.ch/catalog/ROW/UK_English/P_series_catalog.pdf
footprint PKG.M0.4TL.VN (Socket, Female, Through hole)
pins: 1, 2, 3, 4

## PKG.M0.5GL.NA
designator J?
Fixed receptacle with two nuts (back panel mounting), straight print contacts, Key (G), P series, Multipole Type with 5 Contacts; Manufacturer: LEMO; PartNumber: PKG.M0.5GL.NA; Number of contacts: 5; Contact Diameter: 0.9 mm; Test voltage (kV rms) Contact-Contact: 1.05; Rated Current(A): 7; DatasheetVersion: Jun-14; PackageReference: PKG.M0.5GL.NA; PackageDescription: Fixed receptacle with two nuts (back panel mounting), straight print contacts, Key(G) for Printed Circuit; ComponentLink1Description: Manufacturer URL; ComponentLink1URL: http://www.lemo.com; ComponentLink2Description: Datasheet; ComponentLink2URL: http://intra.lemo.ch/catalog/ROW/UK_English/P_series_catalog.pdf
footprint PKG.M0.5GL.NA (Socket, Female, Height 33.5 mm, Through hole)
pins: 1, 2, 3, 4, 5
